# Altium footprint library my Library.PcbLib: 1247 footprints (part 60 of 78)
Each footprint in its own frame and in the unit in brackets; x right, y up, seen from the top. Pads: shape width x height; smd on the part's side, far side on the other; paste and mask are expansions set on the pad; w line width, h text height; cw(c..) or ccw(c..) is an arc to the next point about the centre after c.
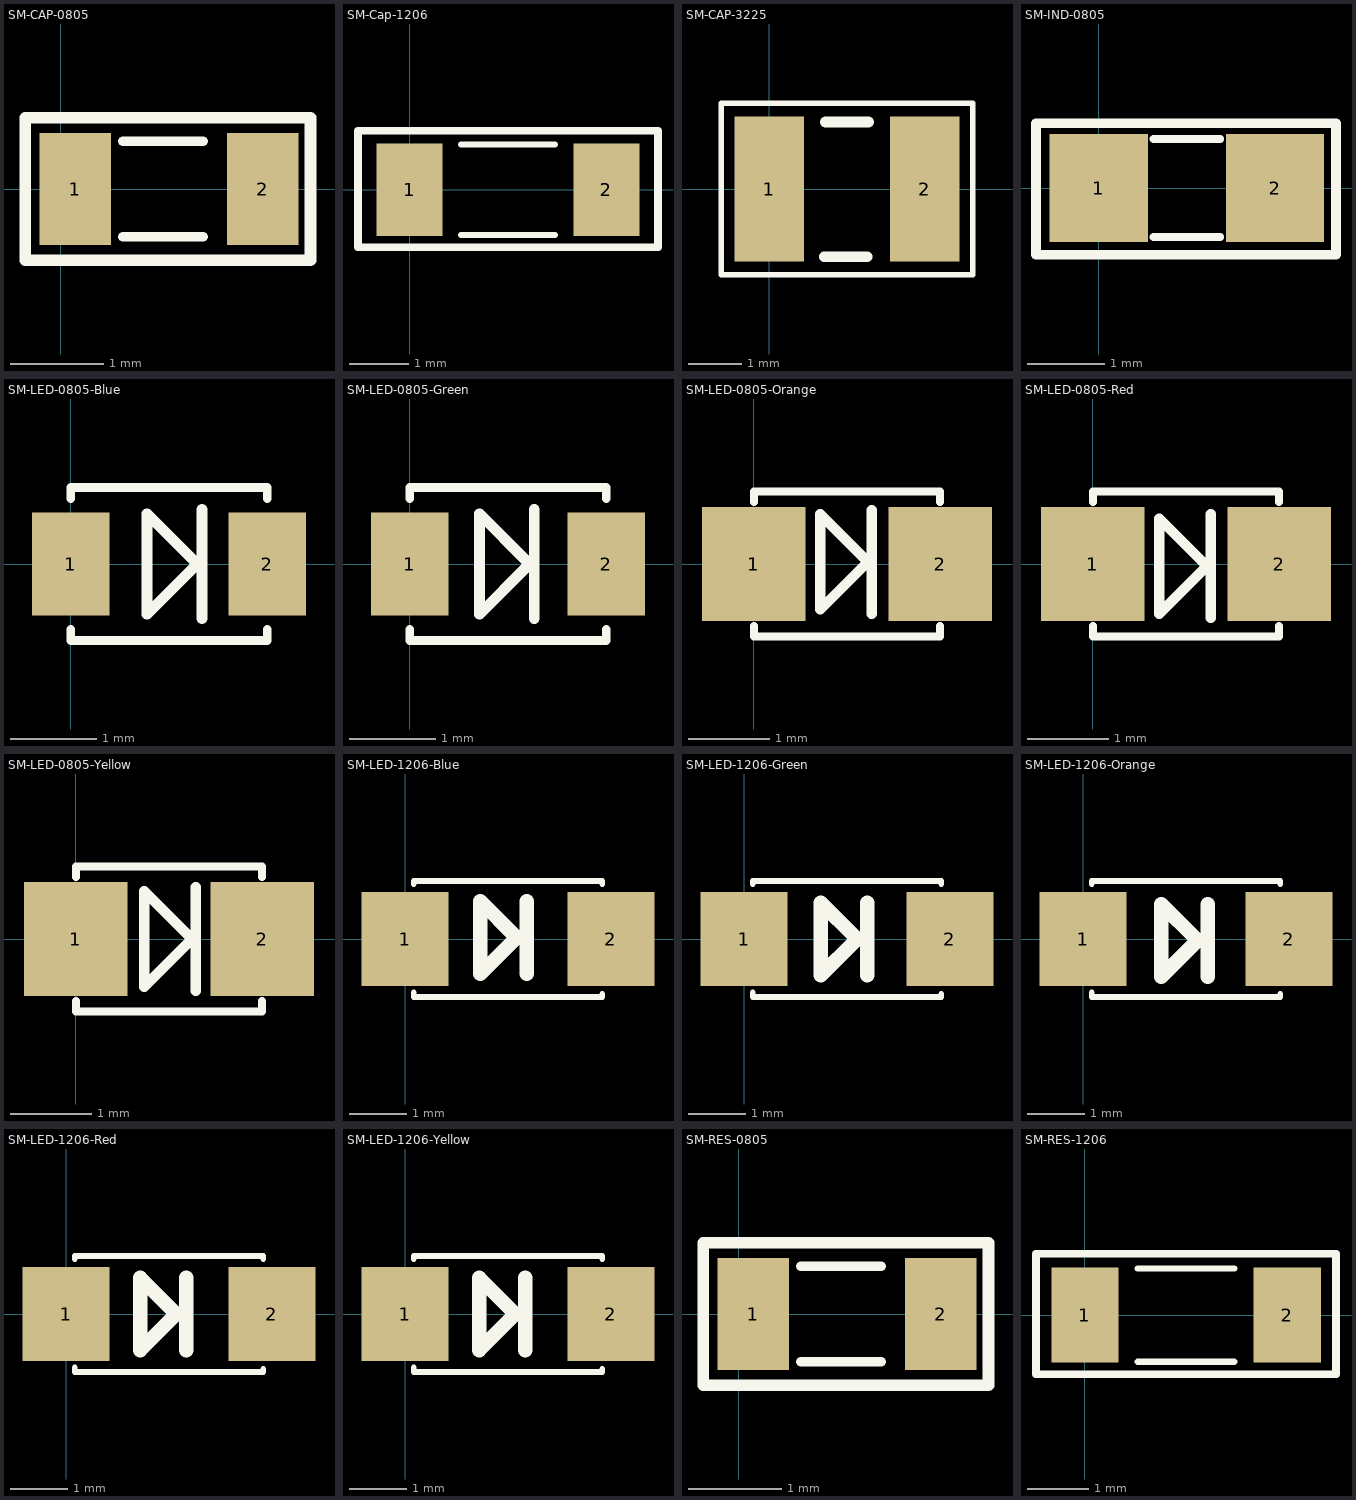
[diagram p59: the footprints below, top view; thin cyan lines are the x and y axes]

## SM-CAP-0805 [mil]
pads (2):
  rect 30x47.24 smd: 1(6,0) 2(85,0)
Top Overlay:
  lines w4: 26,-20 60,-20 ; 26,20 60,20
  lines w5: -15,-30 -15,30 105,30 105,-30 -15,-30
3D body "0805 SMD Capacitor.step": height 31.39, standoff 0.6, extent 5.64,-24.6 84.37,24.61

## SM-Cap-1206 [mm]
pads (2):
  rect 1.1x1.55 smd: 1(0,0) 2(3.302,0)
Top Overlay:
  lines w0.102: 0.864,-0.762 2.438,-0.762 ; 0.864,0.762 2.438,0.762
  lines w0.127: -0.864,-0.965 -0.864,0.991 4.166,0.991 4.166,-0.965 -0.864,-0.965
3D body "1206 SMD Capacitor.step": height 1.02, standoff 0.02, extent 0.026,-0.8 3.226,0.8

## SM-CAP-3225 [mm] "Chip Capacitor, Body 3.2x2.5mm, IPC Medium Density"
height 1.35
pads (2):
  rect 1.3x2.7 smd: 1(0,0) 2(2.9,0)
Top Overlay:
  lines w0.1: -0.9,-1.6 -0.9,1.6 3.8,1.6 3.8,-1.6 -0.9,-1.6
  lines w0.2: 1.025,-1.265 1.825,-1.265 ; 1.05,1.25 1.85,1.25
3D body "SMD Capacitor 3225.step": height 1, standoff 0, extent -0.175,-1.25 3.025,1.25

## SM-IND-0805 [mil]
pads (2):
  rect 50x55 smd: 1(0,0) 2(90,0)
Top Overlay:
  lines w4: 28,-25 62,-25 ; 28,25 62,25
  lines w5: -32,-34 -32,33 121,33 121,-34 -32,-34
3D body "45635.stp": height 9.84, standoff -9.84, extent 5.63,-24.6 84.37,24.61

## SM-LED-0805-Blue [mm]
pads (2):
  rect 0.9x1.2 smd: 1(0,0) 2(2.286,0)
Top Overlay:
  lines w0.102: 0,-0.762 0,-0.889 2.286,-0.889 2.286,-0.762 ; 0,0.762 0,0.889 2.286,0.889 2.286,0.762
  lines w0.127: 1.448,-0.025 0.889,-0.584 0.889,0.584 1.448,0.025 ; 1.524,-0.635 1.524,0.635
3D body "User Library-led_0805-blue.step": height 1.1, standoff 0, extent 0.133,-0.625 2.153,0.625

## SM-LED-0805-Green [mm]
pads (2):
  rect 0.9x1.2 smd: 1(0,0) 2(2.286,0)
Top Overlay:
  lines w0.102: 0,-0.762 0,-0.889 2.286,-0.889 2.286,-0.762 ; 0,0.762 0,0.889 2.286,0.889 2.286,0.762
  lines w0.127: 1.372,-0.025 0.813,-0.584 0.813,0.584 1.372,0.025 ; 1.448,-0.635 1.448,0.635
3D body "User Library-led_0805-Green.step": height 1.1, standoff 0, extent 0.133,-0.625 2.153,0.625

## SM-LED-0805-Orange [mil]
pads (2):
  rect 50x55 smd: 1(0,0) 2(90,0)
Top Overlay:
  lines w4: 0,-30 0,-35 90,-35 90,-30 ; 0,30 0,35 90,35 90,30
  lines w5: 54,0 32,-22 32,24 54,2 ; 57,-24 57,26
3D body "User Library-led_0805-orange.step": height 43.31, standoff 0, extent 5.24,-24.59 84.77,24.62

## SM-LED-0805-Red [mil]
pads (2):
  rect 50x55 smd: 1(0,0) 2(90,0)
Top Overlay:
  lines w4: 0,-30 0,-35 90,-35 90,-30 ; 0,30 0,35 90,35 90,30
  lines w5: 54,-2 32,-24 32,22 54,0 ; 57,-26 57,24
3D body "User Library-led_0805-red.step": height 43.31, standoff 0, extent 5.25,-24.6 84.77,24.62

## SM-LED-0805-Yellow [mil]
pads (2):
  rect 50x55 smd: 1(0,0) 2(90,0)
Top Overlay:
  lines w4: 0,-30 0,-35 90,-35 90,-30 ; 0,30 0,35 90,35 90,30
  lines w5: 55,-1 33,-23 33,23 55,1 ; 58,-25 58,25
3D body "User Library-led_0805-yellow.step": height 43.31, standoff 0, extent 5.25,-24.6 84.77,24.62

## SM-LED-1206-Blue [mil] "Compoment SMD 120x60mil"
height 50
pads (2):
  rect 60x65 smd: 1(0,0) 2(142,0)
Top Overlay:
  lines w4: 6,-37 6,-40 136,-40 136,-38 ; 6,38 6,40 136,40 136,38
  lines w10: 76,0 52,-24 52,26 76,2 ; 84,-24 84,26
3D body "User Library-led_1206-blue.step": height 43.31, standoff 0, extent 6.62,-31.49 133.39,31.5

## SM-LED-1206-Green [mil]
pads (2):
  rect 60x65 smd: 1(0,0) 2(142,0)
Top Overlay:
  lines w4: 6,-37 6,-40 136,-40 136,-38 ; 6,38 6,40 136,40 136,38
  lines w10: 77,-1 53,-25 53,25 77,1 ; 85,-25 85,25
3D body "User Library-led_1206-green.step": height 43.31, standoff 0, extent 6.62,-31.49 133.39,31.5

## SM-LED-1206-Orange [mil]
pads (2):
  rect 60x65 smd: 1(0,0) 2(142,0)
Top Overlay:
  lines w4: 6,-37 6,-40 136,-40 136,-38 ; 6,38 6,40 136,40 136,38
  lines w10: 78,-2 54,-26 54,24 78,0 ; 86,-26 86,24
3D body "User Library-led_1206-yellow.step": height 43.31, standoff 0, extent 6.62,-31.49 133.39,31.5

## SM-LED-1206-Red [mil]
pads (2):
  rect 60x65 smd: 1(0,0) 2(142,0)
Top Overlay:
  lines w4: 6,-37 6,-40 136,-40 136,-38 ; 6,38 6,40 136,40 136,38
  lines w10: 75,-1 51,-25 51,25 75,1 ; 83,-25 83,25
3D body "User Library-led_1206-red.step": height 43.31, standoff 0, extent 6.62,-31.49 133.39,31.5

## SM-LED-1206-Yellow [mil]
pads (2):
  rect 60x65 smd: 1(0,0) 2(142,0)
Top Overlay:
  lines w4: 6,-37 6,-40 136,-40 136,-38 ; 6,38 6,40 136,40 136,38
  lines w10: 75,-1 51,-25 51,25 75,1 ; 83,-25 83,25
3D body "User Library-led_1206-yellow.step": height 43.31, standoff 0, extent 6.62,-31.49 133.39,31.5

## SM-RES-0805 [mil]
pads (2):
  rect 30x47.24 smd: 1(6,0) 2(85,0)
Top Overlay:
  lines w4: 26,-20 60,-20 ; 26,20 60,20
  lines w5: -15,-30 105,-30 105,30 -15,30 -15,-30
3D body "SW3dPS-0805 SMD Resistor.STEP": height 31.39, standoff 0.6, extent 5.64,-24.6 84.38,24.61

## SM-RES-1206 [mm]
pads (2):
  rect 1.1x1.55 smd: 1(0,0) 2(3.302,0)
Top Overlay:
  lines w0.102: 0.864,-0.762 2.438,-0.762 ; 0.864,0.762 2.438,0.762
  lines w0.127: -0.8,-0.965 4.1,-0.965 4.1,1 -0.8,1 -0.8,-0.965
3D body "1206 SMD Resistor.step": height 1.02, standoff 0.02, extent 0.051,-0.8 3.251,0.8